# Altium footprint library Revo_connector_kisun.PcbLib: 90 footprints (part 6 of 6)
Each footprint in its own frame and in the unit in brackets; x right, y up, seen from the top. Pads: shape width x height; smd on the part's side, far side on the other; paste and mask are expansions set on the pad; w line width, h text height; cw(c..) or ccw(c..) is an arc to the next point about the centre after c.
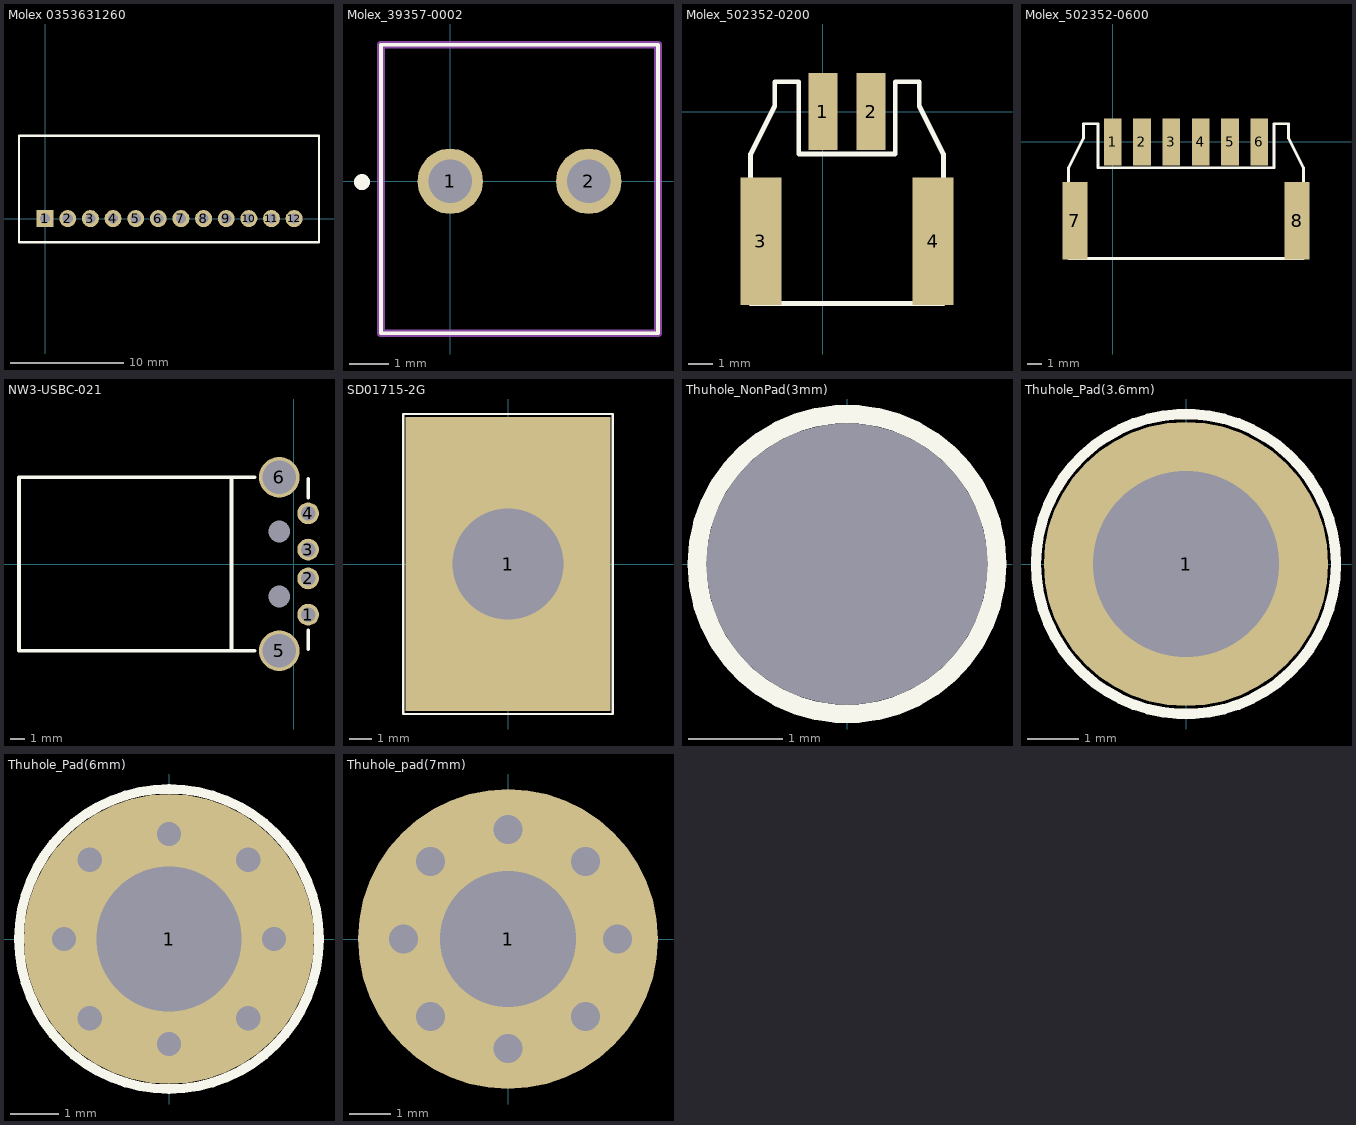
[diagram p5: the footprints below, top view; thin cyan lines are the x and y axes]

## Molex 0353631260 [mm] "Connector; Header; 12 Position"
pads (12):
  rect 1.5x1.5 hole 0.9: 1(0,0)
  round 1.5 hole 0.9: 2(2,0) 3(4,0) 4(6,0) 5(8,0) 6(10,0) 7(12,0) 8(14,0) 9(16,0) 10(18,0) 11(20,0) 12(22,0)
Top Overlay:
  lines w0.2: -2.31,-2.1 24.2,-2.1 24.2,7.33 -2.31,7.33 -2.31,-2.1
3D body "353631260.stp": height 5.75, standoff -2.95, extent -2.18,-2 24.12,8.5

## Molex_39357-0002 [mm]
pads (2):
  round 1.65 hole 1.1: 1(0,0) 2(3.5,0)
Top Overlay:
  lines w0.1: -1.75,-3.84 5.25,-3.84 5.25,3.45 -1.75,3.45 -1.75,-3.84
  lines w0.2: -2.23,-0.12 cw(c-2.23,-0.02) -2.23,0.08 cw(c-2.23,-0.02) -2.23,-0.12
Mechanical 13:
  lines w0.2: -1.75,-3.84 5.25,-3.84 5.25,3.45 -1.75,3.45 -1.75,-3.84
3D body "39357-0002.stp": height 8.43, standoff -3.59, extent -1.816,-3.845 5.296,3.445

## Molex_502352-0200 [mm]
pads (4):
  rect 1.2x3.2 smd: 1(0,0) 2(2,0)
  rect 1.7x5.3 smd: 3(-2.575,-5.38) 4(4.575,-5.38)
Top Overlay:
  lines w0.2: -3,-7.965 -3,-1.765 -2,0.235 -2,1.235 -1,1.235 -1,-1.765 3,-1.765 3,1.235 4,1.235 4,0.235 5,-1.765 5,-7.965 -3,-7.965
3D body "502352-0200.stp": height 6.41, standoff 0.01, extent -2.984,-8.369 5.016,1.031

## Molex_502352-0600 [mm]
pads (8):
  rect 1.2x3.2 smd: 1(0,0) 2(2,0) 3(4,0) 4(6,0) 5(8,0) 6(10,0)
  rect 1.7x5.3 smd: 7(-2.575,-5.38) 8(12.575,-5.38)
Top Overlay:
  lines w0.2: -3,-7.965 -3,-1.765 -2,0.235 -2,1.235 -1,1.235 -1,-1.765 11,-1.765 11,1.235 12,1.235 12,0.235 13,-1.765 13,-7.965 -3,-7.965
3D body "5023520600.stp": height 6.41, standoff 0.01, extent -2.92,-7.948 13.08,1.452

## NW3-USBC-021 [mm]
pads (8):
  round 1.5 hole 1: 1(1,-3.5) 2(1,-1) 3(1,1) 4(1,3.5)
  round 2.8 hole 2.3: 5(-1,-6) 6(-1,6)
  round 0 hole 1.5: 5(-1,-2.25) 5(-1,2.25)
Top Overlay:
  lines w0.254: -4.3,-6 -4.3,6 ; -2.7,-6 -19,-6 -19,6 -2.7,6 ; 1,-5.9 1,-4.6 ; 1,4.6 1,5.9
3D body: height 4.5, standoff 0, extent -19,-5.9 -0.2,6.1

## SD01715-2G [mm]
pads (1):
  rect 9.2x13.2 hole 5: 1(0,0)
Top Overlay:
  lines w0.1: -4.699,-6.731 -4.699,6.731 4.699,6.731 4.699,-6.731 -4.699,-6.731

## Thuhole_NonPad(3mm) [mm] "Thuhole"
pads (1):
  round 0 hole 3: 1(0,0)
Top Overlay:
  circle w0.2: c0,0 r1.6

## Thuhole_Pad(3.6mm) [mm] "Thuhole"
pads (1):
  round 5.5 hole 3.6: 1(0,0)
Top Overlay:
  circle w0.2: c0,0 r2.9

## Thuhole_Pad(6mm) [mm] "Thuhole"
pads (1):
  round 6 hole 3: 1(0,0)
via -1.636,-1.636 diameter 1 hole 0.5
via -1.636,1.636 diameter 1 hole 0.5
via -2.167,0 diameter 1 hole 0.5
via 0,-2.167 diameter 1 hole 0.5
via 0,2.167 diameter 1 hole 0.5
via 1.636,1.636 diameter 1 hole 0.5
via 2.167,0 diameter 1 hole 0.5
via 1.636,-1.636 diameter 1 hole 0.5
Top Overlay:
  circle w0.2: c0,0 r3.1

## Thuhole_pad(7mm) [mm] "Thuhole"
pads (1):
  round 7.3 hole 3.3: 1(0,0)
via 0,2.667 diameter 1.27 hole 0.711
via 0,-2.667 diameter 1.27 hole 0.711
via -2.54,0 diameter 1.27 hole 0.711
via 2.667,0 diameter 1.27 hole 0.711
via -1.886,1.886 diameter 1.27 hole 0.711
via 1.886,-1.886 diameter 1.27 hole 0.711
via -1.886,-1.886 diameter 1.27 hole 0.711
via 1.886,1.886 diameter 1.27 hole 0.711